# Altium footprint library ST封装.PcbLib: 1336 footprints (part 89 of 109)
Each footprint in its own frame and in the unit in brackets; x right, y up, seen from the top. Pads: shape width x height; smd on the part's side, far side on the other; paste and mask are expansions set on the pad; w line width, h text height; cw(c..) or ccw(c..) is an arc to the next point about the centre after c.
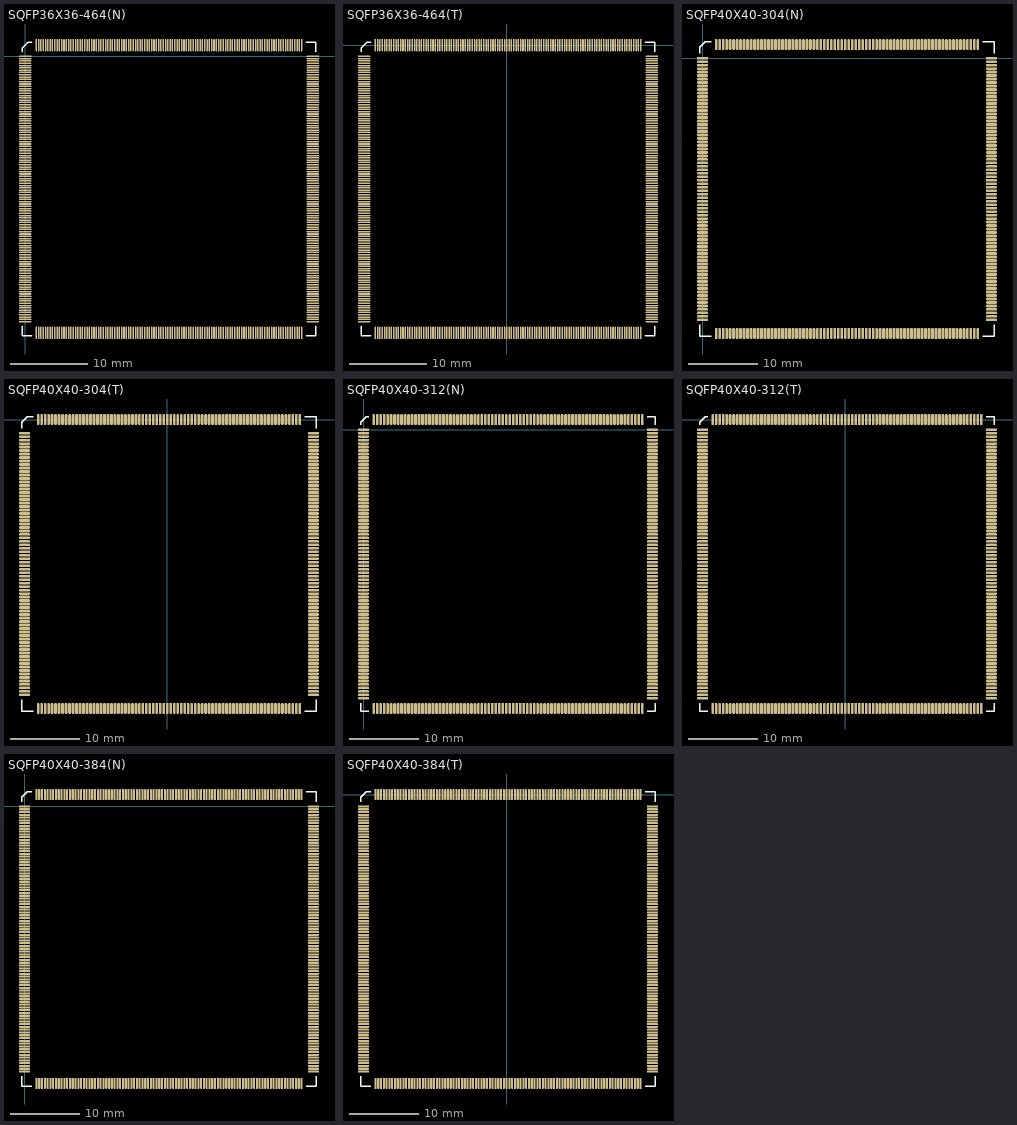
[diagram p88: the footprints below, top view; thin cyan lines are the x and y axes]

## SQFP36X36-464(N) [mm]
pads (464):
  rect 1.6x0.2 smd: 1(0,0)
  oval 1.6x0.2 smd: 2(0,-0.3) 3(0,-0.6) 4(0,-0.9) 5(0,-1.2) 6(0,-1.5) 7(0,-1.8) 8(0,-2.1) 9(0,-2.4) 10(0,-2.7) 11(0,-3) 12(0,-3.3) 13(0,-3.6) 14(0,-3.9) 15(0,-4.2) 16(0,-4.5) 17(0,-4.8) 18(0,-5.1) 19(0,-5.4) 20(0,-5.7) 21(0,-6) 22(0,-6.3) 23(0,-6.6) 24(0,-6.9) 25(0,-7.2) 26(0,-7.5) 27(0,-7.8) 28(0,-8.1) 29(0,-8.4) 30(0,-8.7) 31(0,-9) 32(0,-9.3) 33(0,-9.6) 34(0,-9.9) 35(0,-10.2) 36(0,-10.5) 37(0,-10.8) 38(0,-11.1) 39(0,-11.4) 40(0,-11.7) 41(0,-12) 42(0,-12.3) 43(0,-12.6) 44(0,-12.9) 45(0,-13.2) 46(0,-13.5) 47(0,-13.8) 48(0,-14.1) 49(0,-14.4) 50(0,-14.7) 51(0,-15) 52(0,-15.3) 53(0,-15.6) 54(0,-15.9) 55(0,-16.2) 56(0,-16.5) 57(0,-16.8) 58(0,-17.1) 59(0,-17.4) 60(0,-17.7) 61(0,-18) 62(0,-18.3) 63(0,-18.6) 64(0,-18.9) 65(0,-19.2) 66(0,-19.5) 67(0,-19.8) 68(0,-20.1) 69(0,-20.4) 70(0,-20.7) 71(0,-21) 72(0,-21.3) 73(0,-21.6) 74(0,-21.9) 75(0,-22.2) 76(0,-22.5) 77(0,-22.8) 78(0,-23.1) 79(0,-23.4) 80(0,-23.7) 81(0,-24) 82(0,-24.3) 83(0,-24.6) 84(0,-24.9) 85(0,-25.2) 86(0,-25.5) 87(0,-25.8) 88(0,-26.1) 89(0,-26.4) 90(0,-26.7) 91(0,-27) 92(0,-27.3) 93(0,-27.6) 94(0,-27.9) 95(0,-28.2) 96(0,-28.5) 97(0,-28.8) 98(0,-29.1) 99(0,-29.4) 100(0,-29.7) 101(0,-30) 102(0,-30.3) 103(0,-30.6) 104(0,-30.9) 105(0,-31.2) 106(0,-31.5) 107(0,-31.8) 108(0,-32.1) 109(0,-32.4) 110(0,-32.7) 111(0,-33) 112(0,-33.3) 113(0,-33.6) 114(0,-33.9) 115(0,-34.2) 116(0,-34.5) 233(37.4,-34.5) 234(37.4,-34.2) 235(37.4,-33.9) 236(37.4,-33.6) 237(37.4,-33.3) 238(37.4,-33) 239(37.4,-32.7) 240(37.4,-32.4) 241(37.4,-32.1) 242(37.4,-31.8) 243(37.4,-31.5) 244(37.4,-31.2) 245(37.4,-30.9) 246(37.4,-30.6) 247(37.4,-30.3) 248(37.4,-30) 249(37.4,-29.7) 250(37.4,-29.4) 251(37.4,-29.1) 252(37.4,-28.8) 253(37.4,-28.5) 254(37.4,-28.2) 255(37.4,-27.9) 256(37.4,-27.6) 257(37.4,-27.3) 258(37.4,-27) 259(37.4,-26.7) 260(37.4,-26.4) 261(37.4,-26.1) 262(37.4,-25.8) 263(37.4,-25.5) 264(37.4,-25.2) 265(37.4,-24.9) 266(37.4,-24.6) 267(37.4,-24.3) 268(37.4,-24) 269(37.4,-23.7) 270(37.4,-23.4) 271(37.4,-23.1) 272(37.4,-22.8) 273(37.4,-22.5) 274(37.4,-22.2) 275(37.4,-21.9) 276(37.4,-21.6) 277(37.4,-21.3) 278(37.4,-21) 279(37.4,-20.7) 280(37.4,-20.4) 281(37.4,-20.1) 282(37.4,-19.8) 283(37.4,-19.5) 284(37.4,-19.2) 285(37.4,-18.9) 286(37.4,-18.6) 287(37.4,-18.3) 288(37.4,-18) 289(37.4,-17.7) 290(37.4,-17.4) 291(37.4,-17.1) 292(37.4,-16.8) 293(37.4,-16.5) 294(37.4,-16.2) 295(37.4,-15.9) 296(37.4,-15.6) 297(37.4,-15.3) 298(37.4,-15) 299(37.4,-14.7) 300(37.4,-14.4) 301(37.4,-14.1) 302(37.4,-13.8) 303(37.4,-13.5) 304(37.4,-13.2) 305(37.4,-12.9) 306(37.4,-12.6) 307(37.4,-12.3) 308(37.4,-12) 309(37.4,-11.7) 310(37.4,-11.4) 311(37.4,-11.1) 312(37.4,-10.8) 313(37.4,-10.5) 314(37.4,-10.2) 315(37.4,-9.9) 316(37.4,-9.6) 317(37.4,-9.3) 318(37.4,-9) 319(37.4,-8.7) 320(37.4,-8.4) 321(37.4,-8.1) 322(37.4,-7.8) 323(37.4,-7.5) 324(37.4,-7.2) 325(37.4,-6.9) 326(37.4,-6.6) 327(37.4,-6.3) 328(37.4,-6) 329(37.4,-5.7) 330(37.4,-5.4) 331(37.4,-5.1) 332(37.4,-4.8) 333(37.4,-4.5) 334(37.4,-4.2) 335(37.4,-3.9) 336(37.4,-3.6) 337(37.4,-3.3) 338(37.4,-3) 339(37.4,-2.7) 340(37.4,-2.4) 341(37.4,-2.1) 342(37.4,-1.8) 343(37.4,-1.5) 344(37.4,-1.2) 345(37.4,-0.9) 346(37.4,-0.6) 347(37.4,-0.3) 348(37.4,0)
  oval 0.2x1.6 smd: 117(1.45,-35.95) 118(1.75,-35.95) 119(2.05,-35.95) 120(2.35,-35.95) 121(2.65,-35.95) 122(2.95,-35.95) 123(3.25,-35.95) 124(3.55,-35.95) 125(3.85,-35.95) 126(4.15,-35.95) 127(4.45,-35.95) 128(4.75,-35.95) 129(5.05,-35.95) 130(5.35,-35.95) 131(5.65,-35.95) 132(5.95,-35.95) 133(6.25,-35.95) 134(6.55,-35.95) 135(6.85,-35.95) 136(7.15,-35.95) 137(7.45,-35.95) 138(7.75,-35.95) 139(8.05,-35.95) 140(8.35,-35.95) 141(8.65,-35.95) 142(8.95,-35.95) 143(9.25,-35.95) 144(9.55,-35.95) 145(9.85,-35.95) 146(10.15,-35.95) 147(10.45,-35.95) 148(10.75,-35.95) 149(11.05,-35.95) 150(11.35,-35.95) 151(11.65,-35.95) 152(11.95,-35.95) 153(12.25,-35.95) 154(12.55,-35.95) 155(12.85,-35.95) 156(13.15,-35.95) 157(13.45,-35.95) 158(13.75,-35.95) 159(14.05,-35.95) 160(14.35,-35.95) 161(14.65,-35.95) 162(14.95,-35.95) 163(15.25,-35.95) 164(15.55,-35.95) 165(15.85,-35.95) 166(16.15,-35.95) 167(16.45,-35.95) 168(16.75,-35.95) 169(17.05,-35.95) 170(17.35,-35.95) 171(17.65,-35.95) 172(17.95,-35.95) 173(18.25,-35.95) 174(18.55,-35.95) 175(18.85,-35.95) 176(19.15,-35.95) 177(19.45,-35.95) 178(19.75,-35.95) 179(20.05,-35.95) 180(20.35,-35.95) 181(20.65,-35.95) 182(20.95,-35.95) 183(21.25,-35.95) 184(21.55,-35.95) 185(21.85,-35.95) 186(22.15,-35.95) 187(22.45,-35.95) 188(22.75,-35.95) 189(23.05,-35.95) 190(23.35,-35.95) 191(23.65,-35.95) 192(23.95,-35.95) 193(24.25,-35.95) 194(24.55,-35.95) 195(24.85,-35.95) 196(25.15,-35.95) 197(25.45,-35.95) 198(25.75,-35.95) 199(26.05,-35.95) 200(26.35,-35.95) 201(26.65,-35.95) 202(26.95,-35.95) 203(27.25,-35.95) 204(27.55,-35.95) 205(27.85,-35.95) 206(28.15,-35.95) 207(28.45,-35.95) 208(28.75,-35.95) 209(29.05,-35.95) 210(29.35,-35.95) 211(29.65,-35.95) 212(29.95,-35.95) 213(30.25,-35.95) 214(30.55,-35.95) 215(30.85,-35.95) 216(31.15,-35.95) 217(31.45,-35.95) 218(31.75,-35.95) 219(32.05,-35.95) 220(32.35,-35.95) 221(32.65,-35.95) 222(32.95,-35.95) 223(33.25,-35.95) 224(33.55,-35.95) 225(33.85,-35.95) 226(34.15,-35.95) 227(34.45,-35.95) 228(34.75,-35.95) 229(35.05,-35.95) 230(35.35,-35.95) 231(35.65,-35.95) 232(35.95,-35.95) 349(35.95,1.45) 350(35.65,1.45) 351(35.35,1.45) 352(35.05,1.45) 353(34.75,1.45) 354(34.45,1.45) 355(34.15,1.45) 356(33.85,1.45) 357(33.55,1.45) 358(33.25,1.45) 359(32.95,1.45) 360(32.65,1.45) 361(32.35,1.45) 362(32.05,1.45) 363(31.75,1.45) 364(31.45,1.45) 365(31.15,1.45) 366(30.85,1.45) 367(30.55,1.45) 368(30.25,1.45) 369(29.95,1.45) 370(29.65,1.45) 371(29.35,1.45) 372(29.05,1.45) 373(28.75,1.45) 374(28.45,1.45) 375(28.15,1.45) 376(27.85,1.45) 377(27.55,1.45) 378(27.25,1.45) 379(26.95,1.45) 380(26.65,1.45) 381(26.35,1.45) 382(26.05,1.45) 383(25.75,1.45) 384(25.45,1.45) 385(25.15,1.45) 386(24.85,1.45) 387(24.55,1.45) 388(24.25,1.45) 389(23.95,1.45) 390(23.65,1.45) 391(23.35,1.45) 392(23.05,1.45) 393(22.75,1.45) 394(22.45,1.45) 395(22.15,1.45) 396(21.85,1.45) 397(21.55,1.45) 398(21.25,1.45) 399(20.95,1.45) 400(20.65,1.45) 401(20.35,1.45) 402(20.05,1.45) 403(19.75,1.45) 404(19.45,1.45) 405(19.15,1.45) 406(18.85,1.45) 407(18.55,1.45) 408(18.25,1.45) 409(17.95,1.45) 410(17.65,1.45) 411(17.35,1.45) 412(17.05,1.45) 413(16.75,1.45) 414(16.45,1.45) 415(16.15,1.45) 416(15.85,1.45) 417(15.55,1.45) 418(15.25,1.45) 419(14.95,1.45) 420(14.65,1.45) 421(14.35,1.45) 422(14.05,1.45) 423(13.75,1.45) 424(13.45,1.45) 425(13.15,1.45) 426(12.85,1.45) 427(12.55,1.45) 428(12.25,1.45) 429(11.95,1.45) 430(11.65,1.45) 431(11.35,1.45) 432(11.05,1.45) 433(10.75,1.45) 434(10.45,1.45) 435(10.15,1.45) 436(9.85,1.45) 437(9.55,1.45) 438(9.25,1.45) 439(8.95,1.45) 440(8.65,1.45) 441(8.35,1.45) 442(8.05,1.45) 443(7.75,1.45) 444(7.45,1.45) 445(7.15,1.45) 446(6.85,1.45) 447(6.55,1.45) 448(6.25,1.45) 449(5.95,1.45) 450(5.65,1.45) 451(5.35,1.45) 452(5.05,1.45) 453(4.75,1.45) 454(4.45,1.45) 455(4.15,1.45) 456(3.85,1.45) 457(3.55,1.45) 458(3.25,1.45) 459(2.95,1.45) 460(2.65,1.45) 461(2.35,1.45) 462(2.05,1.45) 463(1.75,1.45) 464(1.45,1.45)
Top Overlay:
  lines w0.2: -0.4,-35.1 -0.4,-36.35 0.85,-36.35 ; -0.4,0.6 -0.4,1.05 0.4,1.85 0.85,1.85 ; 36.55,-36.35 37.8,-36.35 37.8,-35.1 ; 36.55,1.85 37.8,1.85 37.8,0.6

## SQFP36X36-464(T) [mm]
pads (464):
  rect 0.2x1.6 smd: 1(0,0)
  oval 0.2x1.6 smd: 2(-0.3,0) 3(-0.6,0) 4(-0.9,0) 5(-1.2,0) 6(-1.5,0) 7(-1.8,0) 8(-2.1,0) 9(-2.4,0) 10(-2.7,0) 11(-3,0) 12(-3.3,0) 13(-3.6,0) 14(-3.9,0) 15(-4.2,0) 16(-4.5,0) 17(-4.8,0) 18(-5.1,0) 19(-5.4,0) 20(-5.7,0) 21(-6,0) 22(-6.3,0) 23(-6.6,0) 24(-6.9,0) 25(-7.2,0) 26(-7.5,0) 27(-7.8,0) 28(-8.1,0) 29(-8.4,0) 30(-8.7,0) 31(-9,0) 32(-9.3,0) 33(-9.6,0) 34(-9.9,0) 35(-10.2,0) 36(-10.5,0) 37(-10.8,0) 38(-11.1,0) 39(-11.4,0) 40(-11.7,0) 41(-12,0) 42(-12.3,0) 43(-12.6,0) 44(-12.9,0) 45(-13.2,0) 46(-13.5,0) 47(-13.8,0) 48(-14.1,0) 49(-14.4,0) 50(-14.7,0) 51(-15,0) 52(-15.3,0) 53(-15.6,0) 54(-15.9,0) 55(-16.2,0) 56(-16.5,0) 57(-16.8,0) 58(-17.1,0) 175(-17.1,-37.4) 176(-16.8,-37.4) 177(-16.5,-37.4) 178(-16.2,-37.4) 179(-15.9,-37.4) 180(-15.6,-37.4) 181(-15.3,-37.4) 182(-15,-37.4) 183(-14.7,-37.4) 184(-14.4,-37.4) 185(-14.1,-37.4) 186(-13.8,-37.4) 187(-13.5,-37.4) 188(-13.2,-37.4) 189(-12.9,-37.4) 190(-12.6,-37.4) 191(-12.3,-37.4) 192(-12,-37.4) 193(-11.7,-37.4) 194(-11.4,-37.4) 195(-11.1,-37.4) 196(-10.8,-37.4) 197(-10.5,-37.4) 198(-10.2,-37.4) 199(-9.9,-37.4) 200(-9.6,-37.4) 201(-9.3,-37.4) 202(-9,-37.4) 203(-8.7,-37.4) 204(-8.4,-37.4) 205(-8.1,-37.4) 206(-7.8,-37.4) 207(-7.5,-37.4) 208(-7.2,-37.4) 209(-6.9,-37.4) 210(-6.6,-37.4) 211(-6.3,-37.4) 212(-6,-37.4) 213(-5.7,-37.4) 214(-5.4,-37.4) 215(-5.1,-37.4) 216(-4.8,-37.4) 217(-4.5,-37.4) 218(-4.2,-37.4) 219(-3.9,-37.4) 220(-3.6,-37.4) 221(-3.3,-37.4) 222(-3,-37.4) 223(-2.7,-37.4) 224(-2.4,-37.4) 225(-2.1,-37.4) 226(-1.8,-37.4) 227(-1.5,-37.4) 228(-1.2,-37.4) 229(-0.9,-37.4) 230(-0.6,-37.4) 231(-0.3,-37.4) 232(0,-37.4) 233(0.3,-37.4) 234(0.6,-37.4) 235(0.9,-37.4) 236(1.2,-37.4) 237(1.5,-37.4) 238(1.8,-37.4) 239(2.1,-37.4) 240(2.4,-37.4) 241(2.7,-37.4) 242(3,-37.4) 243(3.3,-37.4) 244(3.6,-37.4) 245(3.9,-37.4) 246(4.2,-37.4) 247(4.5,-37.4) 248(4.8,-37.4) 249(5.1,-37.4) 250(5.4,-37.4) 251(5.7,-37.4) 252(6,-37.4) 253(6.3,-37.4) 254(6.6,-37.4) 255(6.9,-37.4) 256(7.2,-37.4) 257(7.5,-37.4) 258(7.8,-37.4) 259(8.1,-37.4) 260(8.4,-37.4) 261(8.7,-37.4) 262(9,-37.4) 263(9.3,-37.4) 264(9.6,-37.4) 265(9.9,-37.4) 266(10.2,-37.4) 267(10.5,-37.4) 268(10.8,-37.4) 269(11.1,-37.4) 270(11.4,-37.4) 271(11.7,-37.4) 272(12,-37.4) 273(12.3,-37.4) 274(12.6,-37.4) 275(12.9,-37.4) 276(13.2,-37.4) 277(13.5,-37.4) 278(13.8,-37.4) 279(14.1,-37.4) 280(14.4,-37.4) 281(14.7,-37.4) 282(15,-37.4) 283(15.3,-37.4) 284(15.6,-37.4) 285(15.9,-37.4) 286(16.2,-37.4) 287(16.5,-37.4) 288(16.8,-37.4) 289(17.1,-37.4) 290(17.4,-37.4) 407(17.4,0) 408(17.1,0) 409(16.8,0) 410(16.5,0) 411(16.2,0) 412(15.9,0) 413(15.6,0) 414(15.3,0) 415(15,0) 416(14.7,0) 417(14.4,0) 418(14.1,0) 419(13.8,0) 420(13.5,0) 421(13.2,0) 422(12.9,0) 423(12.6,0) 424(12.3,0) 425(12,0) 426(11.7,0) 427(11.4,0) 428(11.1,0) 429(10.8,0) 430(10.5,0) 431(10.2,0) 432(9.9,0) 433(9.6,0) 434(9.3,0) 435(9,0) 436(8.7,0) 437(8.4,0) 438(8.1,0) 439(7.8,0) 440(7.5,0) 441(7.2,0) 442(6.9,0) 443(6.6,0) 444(6.3,0) 445(6,0) 446(5.7,0) 447(5.4,0) 448(5.1,0) 449(4.8,0) 450(4.5,0) 451(4.2,0) 452(3.9,0) 453(3.6,0) 454(3.3,0) 455(3,0) 456(2.7,0) 457(2.4,0) 458(2.1,0) 459(1.8,0) 460(1.5,0) 461(1.2,0) 462(0.9,0) 463(0.6,0) 464(0.3,0)
  oval 1.6x0.2 smd: 59(-18.55,-1.45) 60(-18.55,-1.75) 61(-18.55,-2.05) 62(-18.55,-2.35) 63(-18.55,-2.65) 64(-18.55,-2.95) 65(-18.55,-3.25) 66(-18.55,-3.55) 67(-18.55,-3.85) 68(-18.55,-4.15) 69(-18.55,-4.45) 70(-18.55,-4.75) 71(-18.55,-5.05) 72(-18.55,-5.35) 73(-18.55,-5.65) 74(-18.55,-5.95) 75(-18.55,-6.25) 76(-18.55,-6.55) 77(-18.55,-6.85) 78(-18.55,-7.15) 79(-18.55,-7.45) 80(-18.55,-7.75) 81(-18.55,-8.05) 82(-18.55,-8.35) 83(-18.55,-8.65) 84(-18.55,-8.95) 85(-18.55,-9.25) 86(-18.55,-9.55) 87(-18.55,-9.85) 88(-18.55,-10.15) 89(-18.55,-10.45) 90(-18.55,-10.75) 91(-18.55,-11.05) 92(-18.55,-11.35) 93(-18.55,-11.65) 94(-18.55,-11.95) 95(-18.55,-12.25) 96(-18.55,-12.55) 97(-18.55,-12.85) 98(-18.55,-13.15) 99(-18.55,-13.45) 100(-18.55,-13.75) 101(-18.55,-14.05) 102(-18.55,-14.35) 103(-18.55,-14.65) 104(-18.55,-14.95) 105(-18.55,-15.25) 106(-18.55,-15.55) 107(-18.55,-15.85) 108(-18.55,-16.15) 109(-18.55,-16.45) 110(-18.55,-16.75) 111(-18.55,-17.05) 112(-18.55,-17.35) 113(-18.55,-17.65) 114(-18.55,-17.95) 115(-18.55,-18.25) 116(-18.55,-18.55) 117(-18.55,-18.85) 118(-18.55,-19.15) 119(-18.55,-19.45) 120(-18.55,-19.75) 121(-18.55,-20.05) 122(-18.55,-20.35) 123(-18.55,-20.65) 124(-18.55,-20.95) 125(-18.55,-21.25) 126(-18.55,-21.55) 127(-18.55,-21.85) 128(-18.55,-22.15) 129(-18.55,-22.45) 130(-18.55,-22.75) 131(-18.55,-23.05) 132(-18.55,-23.35) 133(-18.55,-23.65) 134(-18.55,-23.95) 135(-18.55,-24.25) 136(-18.55,-24.55) 137(-18.55,-24.85) 138(-18.55,-25.15) 139(-18.55,-25.45) 140(-18.55,-25.75) 141(-18.55,-26.05) 142(-18.55,-26.35) 143(-18.55,-26.65) 144(-18.55,-26.95) 145(-18.55,-27.25) 146(-18.55,-27.55) 147(-18.55,-27.85) 148(-18.55,-28.15) 149(-18.55,-28.45) 150(-18.55,-28.75) 151(-18.55,-29.05) 152(-18.55,-29.35) 153(-18.55,-29.65) 154(-18.55,-29.95) 155(-18.55,-30.25) 156(-18.55,-30.55) 157(-18.55,-30.85) 158(-18.55,-31.15) 159(-18.55,-31.45) 160(-18.55,-31.75) 161(-18.55,-32.05) 162(-18.55,-32.35) 163(-18.55,-32.65) 164(-18.55,-32.95) 165(-18.55,-33.25) 166(-18.55,-33.55) 167(-18.55,-33.85) 168(-18.55,-34.15) 169(-18.55,-34.45) 170(-18.55,-34.75) 171(-18.55,-35.05) 172(-18.55,-35.35) 173(-18.55,-35.65) 174(-18.55,-35.95) 291(18.85,-35.95) 292(18.85,-35.65) 293(18.85,-35.35) 294(18.85,-35.05) 295(18.85,-34.75) 296(18.85,-34.45) 297(18.85,-34.15) 298(18.85,-33.85) 299(18.85,-33.55) 300(18.85,-33.25) 301(18.85,-32.95) 302(18.85,-32.65) 303(18.85,-32.35) 304(18.85,-32.05) 305(18.85,-31.75) 306(18.85,-31.45) 307(18.85,-31.15) 308(18.85,-30.85) 309(18.85,-30.55) 310(18.85,-30.25) 311(18.85,-29.95) 312(18.85,-29.65) 313(18.85,-29.35) 314(18.85,-29.05) 315(18.85,-28.75) 316(18.85,-28.45) 317(18.85,-28.15) 318(18.85,-27.85) 319(18.85,-27.55) 320(18.85,-27.25) 321(18.85,-26.95) 322(18.85,-26.65) 323(18.85,-26.35) 324(18.85,-26.05) 325(18.85,-25.75) 326(18.85,-25.45) 327(18.85,-25.15) 328(18.85,-24.85) 329(18.85,-24.55) 330(18.85,-24.25) 331(18.85,-23.95) 332(18.85,-23.65) 333(18.85,-23.35) 334(18.85,-23.05) 335(18.85,-22.75) 336(18.85,-22.45) 337(18.85,-22.15) 338(18.85,-21.85) 339(18.85,-21.55) 340(18.85,-21.25) 341(18.85,-20.95) 342(18.85,-20.65) 343(18.85,-20.35) 344(18.85,-20.05) 345(18.85,-19.75) 346(18.85,-19.45) 347(18.85,-19.15) 348(18.85,-18.85) 349(18.85,-18.55) 350(18.85,-18.25) 351(18.85,-17.95) 352(18.85,-17.65) 353(18.85,-17.35) 354(18.85,-17.05) 355(18.85,-16.75) 356(18.85,-16.45) 357(18.85,-16.15) 358(18.85,-15.85) 359(18.85,-15.55) 360(18.85,-15.25) 361(18.85,-14.95) 362(18.85,-14.65) 363(18.85,-14.35) 364(18.85,-14.05) 365(18.85,-13.75) 366(18.85,-13.45) 367(18.85,-13.15) 368(18.85,-12.85) 369(18.85,-12.55) 370(18.85,-12.25) 371(18.85,-11.95) 372(18.85,-11.65) 373(18.85,-11.35) 374(18.85,-11.05) 375(18.85,-10.75) 376(18.85,-10.45) 377(18.85,-10.15) 378(18.85,-9.85) 379(18.85,-9.55) 380(18.85,-9.25) 381(18.85,-8.95) 382(18.85,-8.65) 383(18.85,-8.35) 384(18.85,-8.05) 385(18.85,-7.75) 386(18.85,-7.45) 387(18.85,-7.15) 388(18.85,-6.85) 389(18.85,-6.55) 390(18.85,-6.25) 391(18.85,-5.95) 392(18.85,-5.65) 393(18.85,-5.35) 394(18.85,-5.05) 395(18.85,-4.75) 396(18.85,-4.45) 397(18.85,-4.15) 398(18.85,-3.85) 399(18.85,-3.55) 400(18.85,-3.25) 401(18.85,-2.95) 402(18.85,-2.65) 403(18.85,-2.35) 404(18.85,-2.05) 405(18.85,-1.75) 406(18.85,-1.45)
Top Overlay:
  lines w0.2: -18.95,-36.55 -18.95,-37.8 -17.7,-37.8 ; -18.95,-0.85 -18.95,-0.4 -18.15,0.4 -17.7,0.4 ; 18,-37.8 19.25,-37.8 19.25,-36.55 ; 18,0.4 19.25,0.4 19.25,-0.85

## SQFP40X40-304(N) [mm]
pads (304):
  rect 1.6x0.4 smd: 1(0,0)
  oval 1.6x0.4 smd: 2(0,-0.5) 3(0,-1) 4(0,-1.5) 5(0,-2) 6(0,-2.5) 7(0,-3) 8(0,-3.5) 9(0,-4) 10(0,-4.5) 11(0,-5) 12(0,-5.5) 13(0,-6) 14(0,-6.5) 15(0,-7) 16(0,-7.5) 17(0,-8) 18(0,-8.5) 19(0,-9) 20(0,-9.5) 21(0,-10) 22(0,-10.5) 23(0,-11) 24(0,-11.5) 25(0,-12) 26(0,-12.5) 27(0,-13) 28(0,-13.5) 29(0,-14) 30(0,-14.5) 31(0,-15) 32(0,-15.5) 33(0,-16) 34(0,-16.5) 35(0,-17) 36(0,-17.5) 37(0,-18) 38(0,-18.5) 39(0,-19) 40(0,-19.5) 41(0,-20) 42(0,-20.5) 43(0,-21) 44(0,-21.5) 45(0,-22) 46(0,-22.5) 47(0,-23) 48(0,-23.5) 49(0,-24) 50(0,-24.5) 51(0,-25) 52(0,-25.5) 53(0,-26) 54(0,-26.5) 55(0,-27) 56(0,-27.5) 57(0,-28) 58(0,-28.5) 59(0,-29) 60(0,-29.5) 61(0,-30) 62(0,-30.5) 63(0,-31) 64(0,-31.5) 65(0,-32) 66(0,-32.5) 67(0,-33) 68(0,-33.5) 69(0,-34) 70(0,-34.5) 71(0,-35) 72(0,-35.5) 73(0,-36) 74(0,-36.5) 75(0,-37) 76(0,-37.5) 153(41.4,-37.5) 154(41.4,-37) 155(41.4,-36.5) 156(41.4,-36) 157(41.4,-35.5) 158(41.4,-35) 159(41.4,-34.5) 160(41.4,-34) 161(41.4,-33.5) 162(41.4,-33) 163(41.4,-32.5) 164(41.4,-32) 165(41.4,-31.5) 166(41.4,-31) 167(41.4,-30.5) 168(41.4,-30) 169(41.4,-29.5) 170(41.4,-29) 171(41.4,-28.5) 172(41.4,-28) 173(41.4,-27.5) 174(41.4,-27) 175(41.4,-26.5) 176(41.4,-26) 177(41.4,-25.5) 178(41.4,-25) 179(41.4,-24.5) 180(41.4,-24) 181(41.4,-23.5) 182(41.4,-23) 183(41.4,-22.5) 184(41.4,-22) 185(41.4,-21.5) 186(41.4,-21) 187(41.4,-20.5) 188(41.4,-20) 189(41.4,-19.5) 190(41.4,-19) 191(41.4,-18.5) 192(41.4,-18) 193(41.4,-17.5) 194(41.4,-17) 195(41.4,-16.5) 196(41.4,-16) 197(41.4,-15.5) 198(41.4,-15) 199(41.4,-14.5) 200(41.4,-14) 201(41.4,-13.5) 202(41.4,-13) 203(41.4,-12.5) 204(41.4,-12) 205(41.4,-11.5) 206(41.4,-11) 207(41.4,-10.5) 208(41.4,-10) 209(41.4,-9.5) 210(41.4,-9) 211(41.4,-8.5) 212(41.4,-8) 213(41.4,-7.5) 214(41.4,-7) 215(41.4,-6.5) 216(41.4,-6) 217(41.4,-5.5) 218(41.4,-5) 219(41.4,-4.5) 220(41.4,-4) 221(41.4,-3.5) 222(41.4,-3) 223(41.4,-2.5) 224(41.4,-2) 225(41.4,-1.5) 226(41.4,-1) 227(41.4,-0.5) 228(41.4,0)
  oval 0.4x1.6 smd: 77(1.95,-39.45) 78(2.45,-39.45) 79(2.95,-39.45) 80(3.45,-39.45) 81(3.95,-39.45) 82(4.45,-39.45) 83(4.95,-39.45) 84(5.45,-39.45) 85(5.95,-39.45) 86(6.45,-39.45) 87(6.95,-39.45) 88(7.45,-39.45) 89(7.95,-39.45) 90(8.45,-39.45) 91(8.95,-39.45) 92(9.45,-39.45) 93(9.95,-39.45) 94(10.45,-39.45) 95(10.95,-39.45) 96(11.45,-39.45) 97(11.95,-39.45) 98(12.45,-39.45) 99(12.95,-39.45) 100(13.45,-39.45) 101(13.95,-39.45) 102(14.45,-39.45) 103(14.95,-39.45) 104(15.45,-39.45) 105(15.95,-39.45) 106(16.45,-39.45) 107(16.95,-39.45) 108(17.45,-39.45) 109(17.95,-39.45) 110(18.45,-39.45) 111(18.95,-39.45) 112(19.45,-39.45) 113(19.95,-39.45) 114(20.45,-39.45) 115(20.95,-39.45) 116(21.45,-39.45) 117(21.95,-39.45) 118(22.45,-39.45) 119(22.95,-39.45) 120(23.45,-39.45) 121(23.95,-39.45) 122(24.45,-39.45) 123(24.95,-39.45) 124(25.45,-39.45) 125(25.95,-39.45) 126(26.45,-39.45) 127(26.95,-39.45) 128(27.45,-39.45) 129(27.95,-39.45) 130(28.45,-39.45) 131(28.95,-39.45) 132(29.45,-39.45) 133(29.95,-39.45) 134(30.45,-39.45) 135(30.95,-39.45) 136(31.45,-39.45) 137(31.95,-39.45) 138(32.45,-39.45) 139(32.95,-39.45) 140(33.45,-39.45) 141(33.95,-39.45) 142(34.45,-39.45) 143(34.95,-39.45) 144(35.45,-39.45) 145(35.95,-39.45) 146(36.45,-39.45) 147(36.95,-39.45) 148(37.45,-39.45) 149(37.95,-39.45) 150(38.45,-39.45) 151(38.95,-39.45) 152(39.45,-39.45) 229(39.45,1.95) 230(38.95,1.95) 231(38.45,1.95) 232(37.95,1.95) 233(37.45,1.95) 234(36.95,1.95) 235(36.45,1.95) 236(35.95,1.95) 237(35.45,1.95) 238(34.95,1.95) 239(34.45,1.95) 240(33.95,1.95) 241(33.45,1.95) 242(32.95,1.95) 243(32.45,1.95) 244(31.95,1.95) 245(31.45,1.95) 246(30.95,1.95) 247(30.45,1.95) 248(29.95,1.95) 249(29.45,1.95) 250(28.95,1.95) 251(28.45,1.95) 252(27.95,1.95) 253(27.45,1.95) 254(26.95,1.95) 255(26.45,1.95) 256(25.95,1.95) 257(25.45,1.95) 258(24.95,1.95) 259(24.45,1.95) 260(23.95,1.95) 261(23.45,1.95) 262(22.95,1.95) 263(22.45,1.95) 264(21.95,1.95) 265(21.45,1.95) 266(20.95,1.95) 267(20.45,1.95) 268(19.95,1.95) 269(19.45,1.95) 270(18.95,1.95) 271(18.45,1.95) 272(17.95,1.95) 273(17.45,1.95) 274(16.95,1.95) 275(16.45,1.95) 276(15.95,1.95) 277(15.45,1.95) 278(14.95,1.95) 279(14.45,1.95) 280(13.95,1.95) 281(13.45,1.95) 282(12.95,1.95) 283(12.45,1.95) 284(11.95,1.95) 285(11.45,1.95) 286(10.95,1.95) 287(10.45,1.95) 288(9.95,1.95) 289(9.45,1.95) 290(8.95,1.95) 291(8.45,1.95) 292(7.95,1.95) 293(7.45,1.95) 294(6.95,1.95) 295(6.45,1.95) 296(5.95,1.95) 297(5.45,1.95) 298(4.95,1.95) 299(4.45,1.95) 300(3.95,1.95) 301(3.45,1.95) 302(2.95,1.95) 303(2.45,1.95) 304(1.95,1.95)
Top Overlay:
  lines w0.2: -0.4,-38.2 -0.4,-39.85 1.25,-39.85 ; -0.4,0.7 -0.4,1.55 0.4,2.35 1.25,2.35 ; 40.15,-39.85 41.8,-39.85 41.8,-38.2 ; 40.15,2.35 41.8,2.35 41.8,0.7

## SQFP40X40-304(T) [mm]
pads (304):
  rect 0.4x1.6 smd: 1(0,0)
  oval 0.4x1.6 smd: 2(-0.5,0) 3(-1,0) 4(-1.5,0) 5(-2,0) 6(-2.5,0) 7(-3,0) 8(-3.5,0) 9(-4,0) 10(-4.5,0) 11(-5,0) 12(-5.5,0) 13(-6,0) 14(-6.5,0) 15(-7,0) 16(-7.5,0) 17(-8,0) 18(-8.5,0) 19(-9,0) 20(-9.5,0) 21(-10,0) 22(-10.5,0) 23(-11,0) 24(-11.5,0) 25(-12,0) 26(-12.5,0) 27(-13,0) 28(-13.5,0) 29(-14,0) 30(-14.5,0) 31(-15,0) 32(-15.5,0) 33(-16,0) 34(-16.5,0) 35(-17,0) 36(-17.5,0) 37(-18,0) 38(-18.5,0) 115(-18.5,-41.4) 116(-18,-41.4) 117(-17.5,-41.4) 118(-17,-41.4) 119(-16.5,-41.4) 120(-16,-41.4) 121(-15.5,-41.4) 122(-15,-41.4) 123(-14.5,-41.4) 124(-14,-41.4) 125(-13.5,-41.4) 126(-13,-41.4) 127(-12.5,-41.4) 128(-12,-41.4) 129(-11.5,-41.4) 130(-11,-41.4) 131(-10.5,-41.4) 132(-10,-41.4) 133(-9.5,-41.4) 134(-9,-41.4) 135(-8.5,-41.4) 136(-8,-41.4) 137(-7.5,-41.4) 138(-7,-41.4) 139(-6.5,-41.4) 140(-6,-41.4) 141(-5.5,-41.4) 142(-5,-41.4) 143(-4.5,-41.4) 144(-4,-41.4) 145(-3.5,-41.4) 146(-3,-41.4) 147(-2.5,-41.4) 148(-2,-41.4) 149(-1.5,-41.4) 150(-1,-41.4) 151(-0.5,-41.4) 152(0,-41.4) 153(0.5,-41.4) 154(1,-41.4) 155(1.5,-41.4) 156(2,-41.4) 157(2.5,-41.4) 158(3,-41.4) 159(3.5,-41.4) 160(4,-41.4) 161(4.5,-41.4) 162(5,-41.4) 163(5.5,-41.4) 164(6,-41.4) 165(6.5,-41.4) 166(7,-41.4) 167(7.5,-41.4) 168(8,-41.4) 169(8.5,-41.4) 170(9,-41.4) 171(9.5,-41.4) 172(10,-41.4) 173(10.5,-41.4) 174(11,-41.4) 175(11.5,-41.4) 176(12,-41.4) 177(12.5,-41.4) 178(13,-41.4) 179(13.5,-41.4) 180(14,-41.4) 181(14.5,-41.4) 182(15,-41.4) 183(15.5,-41.4) 184(16,-41.4) 185(16.5,-41.4) 186(17,-41.4) 187(17.5,-41.4) 188(18,-41.4) 189(18.5,-41.4) 190(19,-41.4) 267(19,0) 268(18.5,0) 269(18,0) 270(17.5,0) 271(17,0) 272(16.5,0) 273(16,0) 274(15.5,0) 275(15,0) 276(14.5,0) 277(14,0) 278(13.5,0) 279(13,0) 280(12.5,0) 281(12,0) 282(11.5,0) 283(11,0) 284(10.5,0) 285(10,0) 286(9.5,0) 287(9,0) 288(8.5,0) 289(8,0) 290(7.5,0) 291(7,0) 292(6.5,0) 293(6,0) 294(5.5,0) 295(5,0) 296(4.5,0) 297(4,0) 298(3.5,0) 299(3,0) 300(2.5,0) 301(2,0) 302(1.5,0) 303(1,0) 304(0.5,0)
  oval 1.6x0.4 smd: 39(-20.45,-1.95) 40(-20.45,-2.45) 41(-20.45,-2.95) 42(-20.45,-3.45) 43(-20.45,-3.95) 44(-20.45,-4.45) 45(-20.45,-4.95) 46(-20.45,-5.45) 47(-20.45,-5.95) 48(-20.45,-6.45) 49(-20.45,-6.95) 50(-20.45,-7.45) 51(-20.45,-7.95) 52(-20.45,-8.45) 53(-20.45,-8.95) 54(-20.45,-9.45) 55(-20.45,-9.95) 56(-20.45,-10.45) 57(-20.45,-10.95) 58(-20.45,-11.45) 59(-20.45,-11.95) 60(-20.45,-12.45) 61(-20.45,-12.95) 62(-20.45,-13.45) 63(-20.45,-13.95) 64(-20.45,-14.45) 65(-20.45,-14.95) 66(-20.45,-15.45) 67(-20.45,-15.95) 68(-20.45,-16.45) 69(-20.45,-16.95) 70(-20.45,-17.45) 71(-20.45,-17.95) 72(-20.45,-18.45) 73(-20.45,-18.95) 74(-20.45,-19.45) 75(-20.45,-19.95) 76(-20.45,-20.45) 77(-20.45,-20.95) 78(-20.45,-21.45) 79(-20.45,-21.95) 80(-20.45,-22.45) 81(-20.45,-22.95) 82(-20.45,-23.45) 83(-20.45,-23.95) 84(-20.45,-24.45) 85(-20.45,-24.95) 86(-20.45,-25.45) 87(-20.45,-25.95) 88(-20.45,-26.45) 89(-20.45,-26.95) 90(-20.45,-27.45) 91(-20.45,-27.95) 92(-20.45,-28.45) 93(-20.45,-28.95) 94(-20.45,-29.45) 95(-20.45,-29.95) 96(-20.45,-30.45) 97(-20.45,-30.95) 98(-20.45,-31.45) 99(-20.45,-31.95) 100(-20.45,-32.45) 101(-20.45,-32.95) 102(-20.45,-33.45) 103(-20.45,-33.95) 104(-20.45,-34.45) 105(-20.45,-34.95) 106(-20.45,-35.45) 107(-20.45,-35.95) 108(-20.45,-36.45) 109(-20.45,-36.95) 110(-20.45,-37.45) 111(-20.45,-37.95) 112(-20.45,-38.45) 113(-20.45,-38.95) 114(-20.45,-39.45) 191(20.95,-39.45) 192(20.95,-38.95) 193(20.95,-38.45) 194(20.95,-37.95) 195(20.95,-37.45) 196(20.95,-36.95) 197(20.95,-36.45) 198(20.95,-35.95) 199(20.95,-35.45) 200(20.95,-34.95) 201(20.95,-34.45) 202(20.95,-33.95) 203(20.95,-33.45) 204(20.95,-32.95) 205(20.95,-32.45) 206(20.95,-31.95) 207(20.95,-31.45) 208(20.95,-30.95) 209(20.95,-30.45) 210(20.95,-29.95) 211(20.95,-29.45) 212(20.95,-28.95) 213(20.95,-28.45) 214(20.95,-27.95) 215(20.95,-27.45) 216(20.95,-26.95) 217(20.95,-26.45) 218(20.95,-25.95) 219(20.95,-25.45) 220(20.95,-24.95) 221(20.95,-24.45) 222(20.95,-23.95) 223(20.95,-23.45) 224(20.95,-22.95) 225(20.95,-22.45) 226(20.95,-21.95) 227(20.95,-21.45) 228(20.95,-20.95) 229(20.95,-20.45) 230(20.95,-19.95) 231(20.95,-19.45) 232(20.95,-18.95) 233(20.95,-18.45) 234(20.95,-17.95) 235(20.95,-17.45) 236(20.95,-16.95) 237(20.95,-16.45) 238(20.95,-15.95) 239(20.95,-15.45) 240(20.95,-14.95) 241(20.95,-14.45) 242(20.95,-13.95) 243(20.95,-13.45) 244(20.95,-12.95) 245(20.95,-12.45) 246(20.95,-11.95) 247(20.95,-11.45) 248(20.95,-10.95) 249(20.95,-10.45) 250(20.95,-9.95) 251(20.95,-9.45) 252(20.95,-8.95) 253(20.95,-8.45) 254(20.95,-7.95) 255(20.95,-7.45) 256(20.95,-6.95) 257(20.95,-6.45) 258(20.95,-5.95) 259(20.95,-5.45) 260(20.95,-4.95) 261(20.95,-4.45) 262(20.95,-3.95) 263(20.95,-3.45) 264(20.95,-2.95) 265(20.95,-2.45) 266(20.95,-1.95)